# Altium footprint library Connector_PinHeader_1.27mm.PcbLib: 278 footprints (part 16 of 18)
Each footprint in its own frame and in the unit in brackets; x right, y up, seen from the top. Pads: shape width x height; smd on the part's side, far side on the other; paste and mask are expansions set on the pad; w line width, h text height; cw(c..) or ccw(c..) is an arc to the next point about the centre after c.
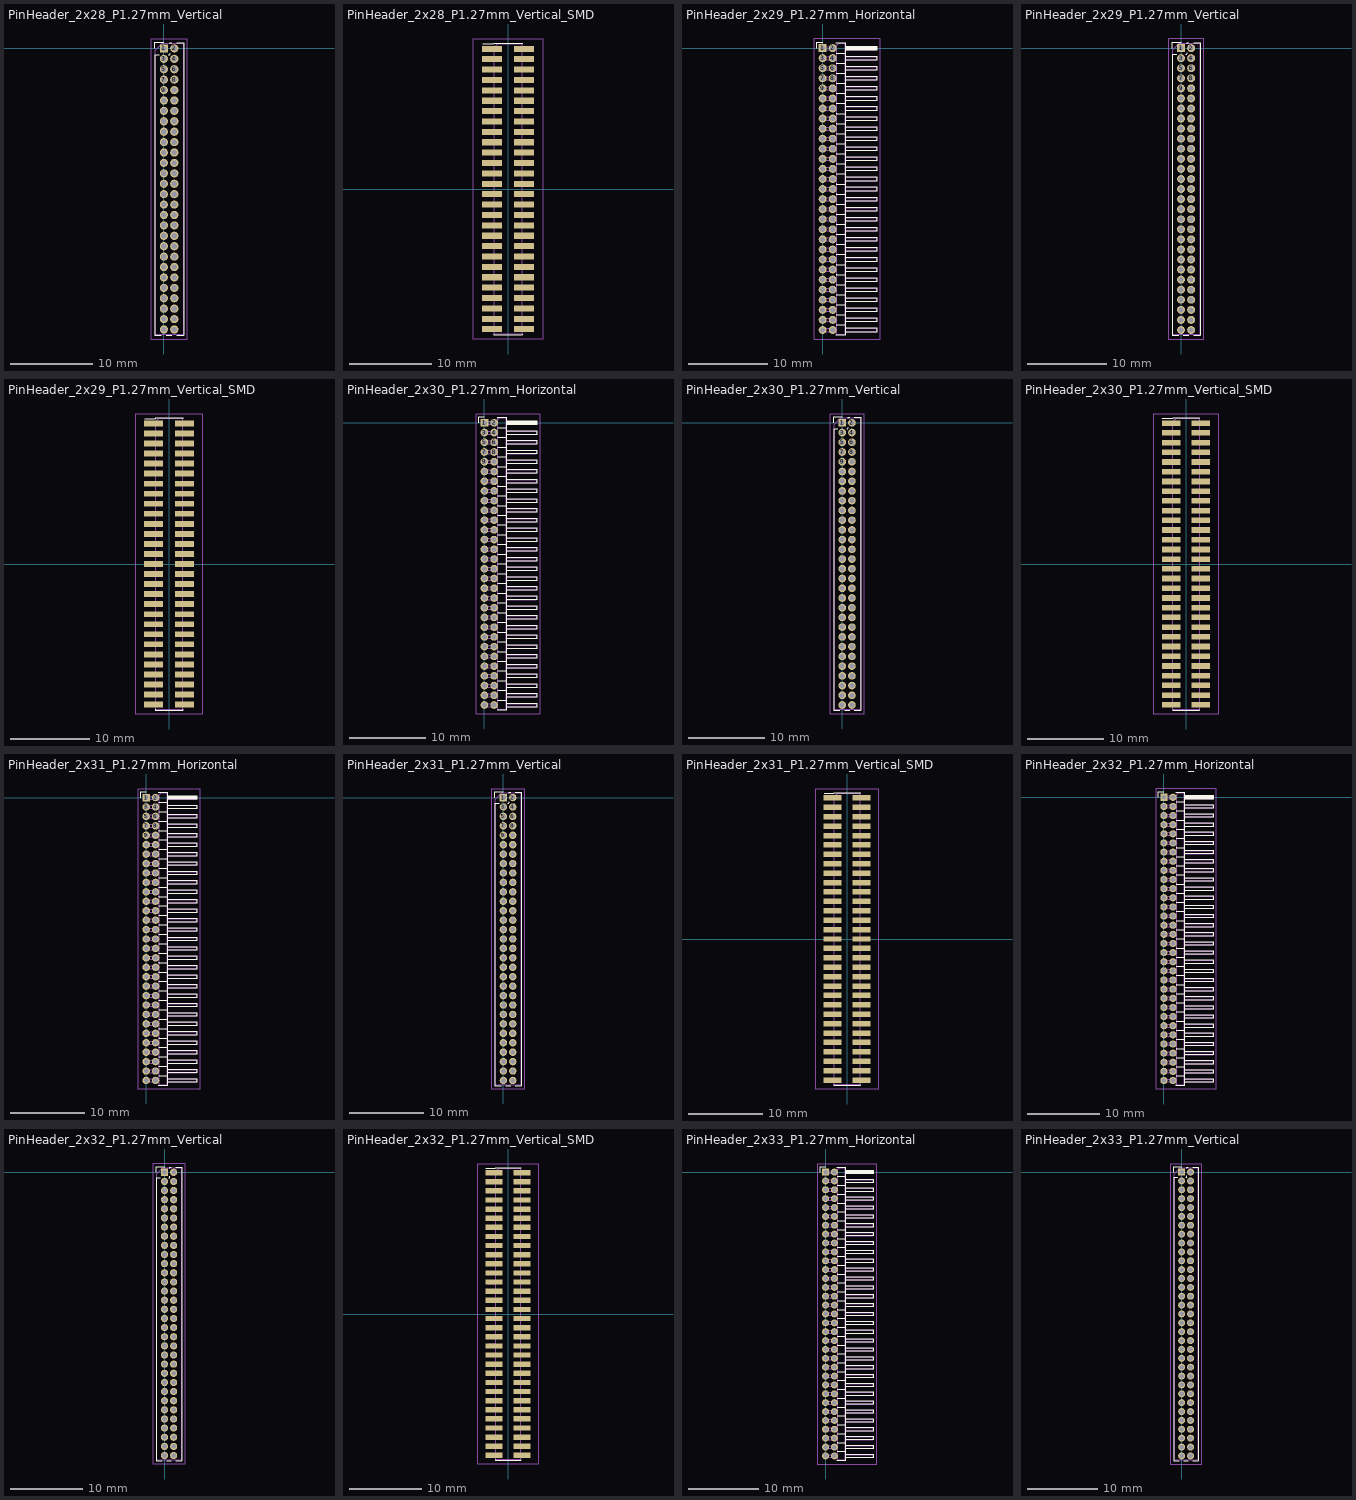
[diagram p15: the footprints below, top view; thin cyan lines are the x and y axes]

## PinHeader_2x28_P1.27mm_Vertical [mm]
pads (56):
  rect 1x1 hole 0.65: 1(0,0)
  rrect100% 1x1 hole 0.65: 2(1.27,0) 3(0,-1.27) 4(1.27,-1.27) 5(0,-2.54) 6(1.27,-2.54) 7(0,-3.81) 8(1.27,-3.81) 9(0,-5.08) 10(1.27,-5.08) 11(0,-6.35) 12(1.27,-6.35) 13(0,-7.62) 14(1.27,-7.62) 15(0,-8.89) 16(1.27,-8.89) 17(0,-10.16) 18(1.27,-10.16) 19(0,-11.43) 20(1.27,-11.43) 21(0,-12.7) 22(1.27,-12.7) 23(0,-13.97) 24(1.27,-13.97) 25(0,-15.24) 26(1.27,-15.24) 27(0,-16.51) 28(1.27,-16.51) 29(0,-17.78) 30(1.27,-17.78) 31(0,-19.05) 32(1.27,-19.05) 33(0,-20.32) 34(1.27,-20.32) 35(0,-21.59) 36(1.27,-21.59) 37(0,-22.86) 38(1.27,-22.86) 39(0,-24.13) 40(1.27,-24.13) 41(0,-25.4) 42(1.27,-25.4) 43(0,-26.67) 44(1.27,-26.67) 45(0,-27.94) 46(1.27,-27.94) 47(0,-29.21) 48(1.27,-29.21) 49(0,-30.48) 50(1.27,-30.48) 51(0,-31.75) 52(1.27,-31.75) 53(0,-33.02) 54(1.27,-33.02) 55(0,-34.29) 56(1.27,-34.29)
F.SilkS:
  lines w0.12: -1.13,0 -1.13,0.76 0,0.76 ; -0.563,-0.76 -1.13,-0.76 -1.13,-34.985 -0.308,-34.985 ; 0.308,-34.985 0.962,-34.985 ; 0.563,-0.76 0.707,-0.76 ; 0.76,-0.707 0.76,-0.563 ; 0.76,0.563 0.76,0.695 0.962,0.695 ; 1.578,-34.985 2.4,-34.985 2.4,0.695 1.578,0.695
F.CrtYd:
  lines w0.05: -1.6,-35.45 -1.6,1.15 2.85,1.15 2.85,-35.45 -1.6,-35.45
F.Fab:
  lines w0.1: -1.07,-34.925 2.34,-34.925 2.34,0.635 -0.218,0.635 -1.07,-0.218 -1.07,-34.925
  text "'.Designator'" at 1.475,-21.192 h1

## PinHeader_2x28_P1.27mm_Vertical_SMD [mm]
pads (56):
  rect 2.4x0.74 smd: 1(-1.95,17.145) 2(1.95,17.145) 3(-1.95,15.875) 4(1.95,15.875) 5(-1.95,14.605) 6(1.95,14.605) 7(-1.95,13.335) 8(1.95,13.335) 9(-1.95,12.065) 10(1.95,12.065) 11(-1.95,10.795) 12(1.95,10.795) 13(-1.95,9.525) 14(1.95,9.525) 15(-1.95,8.255) 16(1.95,8.255) 17(-1.95,6.985) 18(1.95,6.985) 19(-1.95,5.715) 20(1.95,5.715) 21(-1.95,4.445) 22(1.95,4.445) 23(-1.95,3.175) 24(1.95,3.175) 25(-1.95,1.905) 26(1.95,1.905) 27(-1.95,0.635) 28(1.95,0.635) 29(-1.95,-0.635) 30(1.95,-0.635) 31(-1.95,-1.905) 32(1.95,-1.905) 33(-1.95,-3.175) 34(1.95,-3.175) 35(-1.95,-4.445) 36(1.95,-4.445) 37(-1.95,-5.715) 38(1.95,-5.715) 39(-1.95,-6.985) 40(1.95,-6.985) 41(-1.95,-8.255) 42(1.95,-8.255) 43(-1.95,-9.525) 44(1.95,-9.525) 45(-1.95,-10.795) 46(1.95,-10.795) 47(-1.95,-12.065) 48(1.95,-12.065) 49(-1.95,-13.335) 50(1.95,-13.335) 51(-1.95,-14.605) 52(1.95,-14.605) 53(-1.95,-15.875) 54(1.95,-15.875) 55(-1.95,-17.145) 56(1.95,-17.145)
F.SilkS:
  lines w0.12: -3.09,17.775 -1.765,17.775 -1.765,17.84 1.765,17.84 1.765,17.775 ; -1.765,-17.775 -1.765,-17.84 1.765,-17.84 1.765,-17.775
F.CrtYd:
  lines w0.05: -4.3,-18.3 -4.3,18.3 4.3,18.3 4.3,-18.3 -4.3,-18.3
F.Fab:
  drawing of 173 lines, arcs and shapes, not listed
  text "'.Designator'" at 0.84,-4.047 h1

## PinHeader_2x29_P1.27mm_Horizontal [mm]
pads (58):
  rect 1x1 hole 0.65: 1(0,0)
  rrect100% 1x1 hole 0.65: 2(1.27,0) 3(0,-1.27) 4(1.27,-1.27) 5(0,-2.54) 6(1.27,-2.54) 7(0,-3.81) 8(1.27,-3.81) 9(0,-5.08) 10(1.27,-5.08) 11(0,-6.35) 12(1.27,-6.35) 13(0,-7.62) 14(1.27,-7.62) 15(0,-8.89) 16(1.27,-8.89) 17(0,-10.16) 18(1.27,-10.16) 19(0,-11.43) 20(1.27,-11.43) 21(0,-12.7) 22(1.27,-12.7) 23(0,-13.97) 24(1.27,-13.97) 25(0,-15.24) 26(1.27,-15.24) 27(0,-16.51) 28(1.27,-16.51) 29(0,-17.78) 30(1.27,-17.78) 31(0,-19.05) 32(1.27,-19.05) 33(0,-20.32) 34(1.27,-20.32) 35(0,-21.59) 36(1.27,-21.59) 37(0,-22.86) 38(1.27,-22.86) 39(0,-24.13) 40(1.27,-24.13) 41(0,-25.4) 42(1.27,-25.4) 43(0,-26.67) 44(1.27,-26.67) 45(0,-27.94) 46(1.27,-27.94) 47(0,-29.21) 48(1.27,-29.21) 49(0,-30.48) 50(1.27,-30.48) 51(0,-31.75) 52(1.27,-31.75) 53(0,-33.02) 54(1.27,-33.02) 55(0,-34.29) 56(1.27,-34.29) 57(0,-35.56) 58(1.27,-35.56)
F.SilkS:
  drawing of 154 lines, arcs and shapes, not listed
F.CrtYd:
  lines w0.05: -1.15,-36.7 -1.15,1.15 7.3,1.15 7.3,-36.7 -1.15,-36.7
F.Fab:
  drawing of 179 lines, arcs and shapes, not listed
  text "'.Designator'" at 2.774,-20.208 h0.6

## PinHeader_2x29_P1.27mm_Vertical [mm]
pads (58):
  rect 1x1 hole 0.65: 1(0,0)
  rrect100% 1x1 hole 0.65: 2(1.27,0) 3(0,-1.27) 4(1.27,-1.27) 5(0,-2.54) 6(1.27,-2.54) 7(0,-3.81) 8(1.27,-3.81) 9(0,-5.08) 10(1.27,-5.08) 11(0,-6.35) 12(1.27,-6.35) 13(0,-7.62) 14(1.27,-7.62) 15(0,-8.89) 16(1.27,-8.89) 17(0,-10.16) 18(1.27,-10.16) 19(0,-11.43) 20(1.27,-11.43) 21(0,-12.7) 22(1.27,-12.7) 23(0,-13.97) 24(1.27,-13.97) 25(0,-15.24) 26(1.27,-15.24) 27(0,-16.51) 28(1.27,-16.51) 29(0,-17.78) 30(1.27,-17.78) 31(0,-19.05) 32(1.27,-19.05) 33(0,-20.32) 34(1.27,-20.32) 35(0,-21.59) 36(1.27,-21.59) 37(0,-22.86) 38(1.27,-22.86) 39(0,-24.13) 40(1.27,-24.13) 41(0,-25.4) 42(1.27,-25.4) 43(0,-26.67) 44(1.27,-26.67) 45(0,-27.94) 46(1.27,-27.94) 47(0,-29.21) 48(1.27,-29.21) 49(0,-30.48) 50(1.27,-30.48) 51(0,-31.75) 52(1.27,-31.75) 53(0,-33.02) 54(1.27,-33.02) 55(0,-34.29) 56(1.27,-34.29) 57(0,-35.56) 58(1.27,-35.56)
F.SilkS:
  lines w0.12: -1.13,0 -1.13,0.76 0,0.76 ; -0.563,-0.76 -1.13,-0.76 -1.13,-36.255 -0.308,-36.255 ; 0.308,-36.255 0.962,-36.255 ; 0.563,-0.76 0.707,-0.76 ; 0.76,-0.707 0.76,-0.563 ; 0.76,0.563 0.76,0.695 0.962,0.695 ; 1.578,-36.255 2.4,-36.255 2.4,0.695 1.578,0.695
F.CrtYd:
  lines w0.05: -1.6,-36.7 2.85,-36.7 2.85,1.15 -1.6,1.15 -1.6,-36.7
F.Fab:
  lines w0.1: -1.07,-36.195 2.34,-36.195 2.34,0.635 -0.218,0.635 -1.07,-0.218 -1.07,-36.195
  text "'.Designator'" at 1.475,-21.827 h1

## PinHeader_2x29_P1.27mm_Vertical_SMD [mm]
pads (58):
  rect 2.4x0.74 smd: 1(-1.95,17.78) 2(1.95,17.78) 3(-1.95,16.51) 4(1.95,16.51) 5(-1.95,15.24) 6(1.95,15.24) 7(-1.95,13.97) 8(1.95,13.97) 9(-1.95,12.7) 10(1.95,12.7) 11(-1.95,11.43) 12(1.95,11.43) 13(-1.95,10.16) 14(1.95,10.16) 15(-1.95,8.89) 16(1.95,8.89) 17(-1.95,7.62) 18(1.95,7.62) 19(-1.95,6.35) 20(1.95,6.35) 21(-1.95,5.08) 22(1.95,5.08) 23(-1.95,3.81) 24(1.95,3.81) 25(-1.95,2.54) 26(1.95,2.54) 27(-1.95,1.27) 28(1.95,1.27) 29(-1.95,0) 30(1.95,0) 31(-1.95,-1.27) 32(1.95,-1.27) 33(-1.95,-2.54) 34(1.95,-2.54) 35(-1.95,-3.81) 36(1.95,-3.81) 37(-1.95,-5.08) 38(1.95,-5.08) 39(-1.95,-6.35) 40(1.95,-6.35) 41(-1.95,-7.62) 42(1.95,-7.62) 43(-1.95,-8.89) 44(1.95,-8.89) 45(-1.95,-10.16) 46(1.95,-10.16) 47(-1.95,-11.43) 48(1.95,-11.43) 49(-1.95,-12.7) 50(1.95,-12.7) 51(-1.95,-13.97) 52(1.95,-13.97) 53(-1.95,-15.24) 54(1.95,-15.24) 55(-1.95,-16.51) 56(1.95,-16.51) 57(-1.95,-17.78) 58(1.95,-17.78)
F.SilkS:
  lines w0.12: -3.09,18.41 -1.765,18.41 -1.765,18.475 1.765,18.475 1.765,18.41 ; -1.765,-18.41 -1.765,-18.475 1.765,-18.475 1.765,-18.41
F.CrtYd:
  lines w0.05: -4.3,-18.95 -4.3,18.95 4.3,18.95 4.3,-18.95 -4.3,-18.95
F.Fab:
  drawing of 179 lines, arcs and shapes, not listed
  text "'.Designator'" at 0.84,-4.047 h1

## PinHeader_2x30_P1.27mm_Horizontal [mm]
pads (60):
  rect 1x1 hole 0.65: 1(0,0)
  rrect100% 1x1 hole 0.65: 2(1.27,0) 3(0,-1.27) 4(1.27,-1.27) 5(0,-2.54) 6(1.27,-2.54) 7(0,-3.81) 8(1.27,-3.81) 9(0,-5.08) 10(1.27,-5.08) 11(0,-6.35) 12(1.27,-6.35) 13(0,-7.62) 14(1.27,-7.62) 15(0,-8.89) 16(1.27,-8.89) 17(0,-10.16) 18(1.27,-10.16) 19(0,-11.43) 20(1.27,-11.43) 21(0,-12.7) 22(1.27,-12.7) 23(0,-13.97) 24(1.27,-13.97) 25(0,-15.24) 26(1.27,-15.24) 27(0,-16.51) 28(1.27,-16.51) 29(0,-17.78) 30(1.27,-17.78) 31(0,-19.05) 32(1.27,-19.05) 33(0,-20.32) 34(1.27,-20.32) 35(0,-21.59) 36(1.27,-21.59) 37(0,-22.86) 38(1.27,-22.86) 39(0,-24.13) 40(1.27,-24.13) 41(0,-25.4) 42(1.27,-25.4) 43(0,-26.67) 44(1.27,-26.67) 45(0,-27.94) 46(1.27,-27.94) 47(0,-29.21) 48(1.27,-29.21) 49(0,-30.48) 50(1.27,-30.48) 51(0,-31.75) 52(1.27,-31.75) 53(0,-33.02) 54(1.27,-33.02) 55(0,-34.29) 56(1.27,-34.29) 57(0,-35.56) 58(1.27,-35.56) 59(0,-36.83) 60(1.27,-36.83)
F.SilkS:
  drawing of 159 lines, arcs and shapes, not listed
F.CrtYd:
  lines w0.05: -1.15,-38 7.3,-38 7.3,1.15 -1.15,1.15 -1.15,-38
F.Fab:
  drawing of 185 lines, arcs and shapes, not listed
  text "'.Designator'" at 2.774,-20.843 h0.6

## PinHeader_2x30_P1.27mm_Vertical [mm]
pads (60):
  rect 1x1 hole 0.65: 1(0,0)
  rrect100% 1x1 hole 0.65: 2(1.27,0) 3(0,-1.27) 4(1.27,-1.27) 5(0,-2.54) 6(1.27,-2.54) 7(0,-3.81) 8(1.27,-3.81) 9(0,-5.08) 10(1.27,-5.08) 11(0,-6.35) 12(1.27,-6.35) 13(0,-7.62) 14(1.27,-7.62) 15(0,-8.89) 16(1.27,-8.89) 17(0,-10.16) 18(1.27,-10.16) 19(0,-11.43) 20(1.27,-11.43) 21(0,-12.7) 22(1.27,-12.7) 23(0,-13.97) 24(1.27,-13.97) 25(0,-15.24) 26(1.27,-15.24) 27(0,-16.51) 28(1.27,-16.51) 29(0,-17.78) 30(1.27,-17.78) 31(0,-19.05) 32(1.27,-19.05) 33(0,-20.32) 34(1.27,-20.32) 35(0,-21.59) 36(1.27,-21.59) 37(0,-22.86) 38(1.27,-22.86) 39(0,-24.13) 40(1.27,-24.13) 41(0,-25.4) 42(1.27,-25.4) 43(0,-26.67) 44(1.27,-26.67) 45(0,-27.94) 46(1.27,-27.94) 47(0,-29.21) 48(1.27,-29.21) 49(0,-30.48) 50(1.27,-30.48) 51(0,-31.75) 52(1.27,-31.75) 53(0,-33.02) 54(1.27,-33.02) 55(0,-34.29) 56(1.27,-34.29) 57(0,-35.56) 58(1.27,-35.56) 59(0,-36.83) 60(1.27,-36.83)
F.SilkS:
  lines w0.12: -1.13,0 -1.13,0.76 0,0.76 ; -0.563,-0.76 -1.13,-0.76 -1.13,-37.525 -0.308,-37.525 ; 0.308,-37.525 0.962,-37.525 ; 0.563,-0.76 0.707,-0.76 ; 0.76,-0.707 0.76,-0.563 ; 0.76,0.563 0.76,0.695 0.962,0.695 ; 1.578,-37.525 2.4,-37.525 2.4,0.695 1.578,0.695
F.CrtYd:
  lines w0.05: -1.6,-38 -1.6,1.15 2.85,1.15 2.85,-38 -1.6,-38
F.Fab:
  lines w0.1: -1.07,-37.465 2.34,-37.465 2.34,0.635 -0.218,0.635 -1.07,-0.218 -1.07,-37.465
  text "'.Designator'" at 1.475,-22.462 h1

## PinHeader_2x30_P1.27mm_Vertical_SMD [mm]
pads (60):
  rect 2.4x0.74 smd: 1(-1.95,18.415) 2(1.95,18.415) 3(-1.95,17.145) 4(1.95,17.145) 5(-1.95,15.875) 6(1.95,15.875) 7(-1.95,14.605) 8(1.95,14.605) 9(-1.95,13.335) 10(1.95,13.335) 11(-1.95,12.065) 12(1.95,12.065) 13(-1.95,10.795) 14(1.95,10.795) 15(-1.95,9.525) 16(1.95,9.525) 17(-1.95,8.255) 18(1.95,8.255) 19(-1.95,6.985) 20(1.95,6.985) 21(-1.95,5.715) 22(1.95,5.715) 23(-1.95,4.445) 24(1.95,4.445) 25(-1.95,3.175) 26(1.95,3.175) 27(-1.95,1.905) 28(1.95,1.905) 29(-1.95,0.635) 30(1.95,0.635) 31(-1.95,-0.635) 32(1.95,-0.635) 33(-1.95,-1.905) 34(1.95,-1.905) 35(-1.95,-3.175) 36(1.95,-3.175) 37(-1.95,-4.445) 38(1.95,-4.445) 39(-1.95,-5.715) 40(1.95,-5.715) 41(-1.95,-6.985) 42(1.95,-6.985) 43(-1.95,-8.255) 44(1.95,-8.255) 45(-1.95,-9.525) 46(1.95,-9.525) 47(-1.95,-10.795) 48(1.95,-10.795) 49(-1.95,-12.065) 50(1.95,-12.065) 51(-1.95,-13.335) 52(1.95,-13.335) 53(-1.95,-14.605) 54(1.95,-14.605) 55(-1.95,-15.875) 56(1.95,-15.875) 57(-1.95,-17.145) 58(1.95,-17.145) 59(-1.95,-18.415) 60(1.95,-18.415)
F.SilkS:
  lines w0.12: -3.09,19.045 -1.765,19.045 -1.765,19.11 1.765,19.11 1.765,19.045 ; -1.765,-19.045 -1.765,-19.11 1.765,-19.11 1.765,-19.045
F.CrtYd:
  lines w0.05: -4.3,-19.55 4.3,-19.55 4.3,19.55 -4.3,19.55 -4.3,-19.55
F.Fab:
  drawing of 185 lines, arcs and shapes, not listed
  text "'.Designator'" at 0.84,-4.047 h1

## PinHeader_2x31_P1.27mm_Horizontal [mm]
pads (62):
  rect 1x1 hole 0.65: 1(0,0)
  rrect100% 1x1 hole 0.65: 2(1.27,0) 3(0,-1.27) 4(1.27,-1.27) 5(0,-2.54) 6(1.27,-2.54) 7(0,-3.81) 8(1.27,-3.81) 9(0,-5.08) 10(1.27,-5.08) 11(0,-6.35) 12(1.27,-6.35) 13(0,-7.62) 14(1.27,-7.62) 15(0,-8.89) 16(1.27,-8.89) 17(0,-10.16) 18(1.27,-10.16) 19(0,-11.43) 20(1.27,-11.43) 21(0,-12.7) 22(1.27,-12.7) 23(0,-13.97) 24(1.27,-13.97) 25(0,-15.24) 26(1.27,-15.24) 27(0,-16.51) 28(1.27,-16.51) 29(0,-17.78) 30(1.27,-17.78) 31(0,-19.05) 32(1.27,-19.05) 33(0,-20.32) 34(1.27,-20.32) 35(0,-21.59) 36(1.27,-21.59) 37(0,-22.86) 38(1.27,-22.86) 39(0,-24.13) 40(1.27,-24.13) 41(0,-25.4) 42(1.27,-25.4) 43(0,-26.67) 44(1.27,-26.67) 45(0,-27.94) 46(1.27,-27.94) 47(0,-29.21) 48(1.27,-29.21) 49(0,-30.48) 50(1.27,-30.48) 51(0,-31.75) 52(1.27,-31.75) 53(0,-33.02) 54(1.27,-33.02) 55(0,-34.29) 56(1.27,-34.29) 57(0,-35.56) 58(1.27,-35.56) 59(0,-36.83) 60(1.27,-36.83) 61(0,-38.1) 62(1.27,-38.1)
F.SilkS:
  drawing of 164 lines, arcs and shapes, not listed
F.CrtYd:
  lines w0.05: -1.15,-39.25 7.3,-39.25 7.3,1.15 -1.15,1.15 -1.15,-39.25
F.Fab:
  drawing of 191 lines, arcs and shapes, not listed
  text "'.Designator'" at 2.774,-21.478 h0.6

## PinHeader_2x31_P1.27mm_Vertical [mm]
pads (62):
  rect 1x1 hole 0.65: 1(0,0)
  rrect100% 1x1 hole 0.65: 2(1.27,0) 3(0,-1.27) 4(1.27,-1.27) 5(0,-2.54) 6(1.27,-2.54) 7(0,-3.81) 8(1.27,-3.81) 9(0,-5.08) 10(1.27,-5.08) 11(0,-6.35) 12(1.27,-6.35) 13(0,-7.62) 14(1.27,-7.62) 15(0,-8.89) 16(1.27,-8.89) 17(0,-10.16) 18(1.27,-10.16) 19(0,-11.43) 20(1.27,-11.43) 21(0,-12.7) 22(1.27,-12.7) 23(0,-13.97) 24(1.27,-13.97) 25(0,-15.24) 26(1.27,-15.24) 27(0,-16.51) 28(1.27,-16.51) 29(0,-17.78) 30(1.27,-17.78) 31(0,-19.05) 32(1.27,-19.05) 33(0,-20.32) 34(1.27,-20.32) 35(0,-21.59) 36(1.27,-21.59) 37(0,-22.86) 38(1.27,-22.86) 39(0,-24.13) 40(1.27,-24.13) 41(0,-25.4) 42(1.27,-25.4) 43(0,-26.67) 44(1.27,-26.67) 45(0,-27.94) 46(1.27,-27.94) 47(0,-29.21) 48(1.27,-29.21) 49(0,-30.48) 50(1.27,-30.48) 51(0,-31.75) 52(1.27,-31.75) 53(0,-33.02) 54(1.27,-33.02) 55(0,-34.29) 56(1.27,-34.29) 57(0,-35.56) 58(1.27,-35.56) 59(0,-36.83) 60(1.27,-36.83) 61(0,-38.1) 62(1.27,-38.1)
F.SilkS:
  lines w0.12: -1.13,0 -1.13,0.76 0,0.76 ; -0.563,-0.76 -1.13,-0.76 -1.13,-38.795 -0.308,-38.795 ; 0.308,-38.795 0.962,-38.795 ; 0.563,-0.76 0.707,-0.76 ; 0.76,-0.707 0.76,-0.563 ; 0.76,0.563 0.76,0.695 0.962,0.695 ; 1.578,-38.795 2.4,-38.795 2.4,0.695 1.578,0.695
F.CrtYd:
  lines w0.05: -1.6,-39.25 2.85,-39.25 2.85,1.15 -1.6,1.15 -1.6,-39.25
F.Fab:
  lines w0.1: -1.07,-38.735 2.34,-38.735 2.34,0.635 -0.218,0.635 -1.07,-0.218 -1.07,-38.735
  text "'.Designator'" at 1.475,-23.097 h1

## PinHeader_2x31_P1.27mm_Vertical_SMD [mm]
pads (62):
  rect 2.4x0.74 smd: 1(-1.95,19.05) 2(1.95,19.05) 3(-1.95,17.78) 4(1.95,17.78) 5(-1.95,16.51) 6(1.95,16.51) 7(-1.95,15.24) 8(1.95,15.24) 9(-1.95,13.97) 10(1.95,13.97) 11(-1.95,12.7) 12(1.95,12.7) 13(-1.95,11.43) 14(1.95,11.43) 15(-1.95,10.16) 16(1.95,10.16) 17(-1.95,8.89) 18(1.95,8.89) 19(-1.95,7.62) 20(1.95,7.62) 21(-1.95,6.35) 22(1.95,6.35) 23(-1.95,5.08) 24(1.95,5.08) 25(-1.95,3.81) 26(1.95,3.81) 27(-1.95,2.54) 28(1.95,2.54) 29(-1.95,1.27) 30(1.95,1.27) 31(-1.95,0) 32(1.95,0) 33(-1.95,-1.27) 34(1.95,-1.27) 35(-1.95,-2.54) 36(1.95,-2.54) 37(-1.95,-3.81) 38(1.95,-3.81) 39(-1.95,-5.08) 40(1.95,-5.08) 41(-1.95,-6.35) 42(1.95,-6.35) 43(-1.95,-7.62) 44(1.95,-7.62) 45(-1.95,-8.89) 46(1.95,-8.89) 47(-1.95,-10.16) 48(1.95,-10.16) 49(-1.95,-11.43) 50(1.95,-11.43) 51(-1.95,-12.7) 52(1.95,-12.7) 53(-1.95,-13.97) 54(1.95,-13.97) 55(-1.95,-15.24) 56(1.95,-15.24) 57(-1.95,-16.51) 58(1.95,-16.51) 59(-1.95,-17.78) 60(1.95,-17.78) 61(-1.95,-19.05) 62(1.95,-19.05)
F.SilkS:
  lines w0.12: -3.09,19.68 -1.765,19.68 -1.765,19.745 1.765,19.745 1.765,19.68 ; -1.765,-19.68 -1.765,-19.745 1.765,-19.745 1.765,-19.68
F.CrtYd:
  lines w0.05: -4.3,-20.2 4.3,-20.2 4.3,20.2 -4.3,20.2 -4.3,-20.2
F.Fab:
  drawing of 191 lines, arcs and shapes, not listed
  text "'.Designator'" at 0.84,-4.047 h1

## PinHeader_2x32_P1.27mm_Horizontal [mm]
pads (64):
  rect 1x1 hole 0.65: 1(0,0)
  rrect100% 1x1 hole 0.65: 2(1.27,0) 3(0,-1.27) 4(1.27,-1.27) 5(0,-2.54) 6(1.27,-2.54) 7(0,-3.81) 8(1.27,-3.81) 9(0,-5.08) 10(1.27,-5.08) 11(0,-6.35) 12(1.27,-6.35) 13(0,-7.62) 14(1.27,-7.62) 15(0,-8.89) 16(1.27,-8.89) 17(0,-10.16) 18(1.27,-10.16) 19(0,-11.43) 20(1.27,-11.43) 21(0,-12.7) 22(1.27,-12.7) 23(0,-13.97) 24(1.27,-13.97) 25(0,-15.24) 26(1.27,-15.24) 27(0,-16.51) 28(1.27,-16.51) 29(0,-17.78) 30(1.27,-17.78) 31(0,-19.05) 32(1.27,-19.05) 33(0,-20.32) 34(1.27,-20.32) 35(0,-21.59) 36(1.27,-21.59) 37(0,-22.86) 38(1.27,-22.86) 39(0,-24.13) 40(1.27,-24.13) 41(0,-25.4) 42(1.27,-25.4) 43(0,-26.67) 44(1.27,-26.67) 45(0,-27.94) 46(1.27,-27.94) 47(0,-29.21) 48(1.27,-29.21) 49(0,-30.48) 50(1.27,-30.48) 51(0,-31.75) 52(1.27,-31.75) 53(0,-33.02) 54(1.27,-33.02) 55(0,-34.29) 56(1.27,-34.29) 57(0,-35.56) 58(1.27,-35.56) 59(0,-36.83) 60(1.27,-36.83) 61(0,-38.1) 62(1.27,-38.1) 63(0,-39.37) 64(1.27,-39.37)
F.SilkS:
  drawing of 169 lines, arcs and shapes, not listed
F.CrtYd:
  lines w0.05: -1.15,-40.55 7.3,-40.55 7.3,1.15 -1.15,1.15 -1.15,-40.55
F.Fab:
  drawing of 197 lines, arcs and shapes, not listed
  text "'.Designator'" at 2.774,-22.113 h0.6

## PinHeader_2x32_P1.27mm_Vertical [mm]
pads (64):
  rect 1x1 hole 0.65: 1(0,0)
  rrect100% 1x1 hole 0.65: 2(1.27,0) 3(0,-1.27) 4(1.27,-1.27) 5(0,-2.54) 6(1.27,-2.54) 7(0,-3.81) 8(1.27,-3.81) 9(0,-5.08) 10(1.27,-5.08) 11(0,-6.35) 12(1.27,-6.35) 13(0,-7.62) 14(1.27,-7.62) 15(0,-8.89) 16(1.27,-8.89) 17(0,-10.16) 18(1.27,-10.16) 19(0,-11.43) 20(1.27,-11.43) 21(0,-12.7) 22(1.27,-12.7) 23(0,-13.97) 24(1.27,-13.97) 25(0,-15.24) 26(1.27,-15.24) 27(0,-16.51) 28(1.27,-16.51) 29(0,-17.78) 30(1.27,-17.78) 31(0,-19.05) 32(1.27,-19.05) 33(0,-20.32) 34(1.27,-20.32) 35(0,-21.59) 36(1.27,-21.59) 37(0,-22.86) 38(1.27,-22.86) 39(0,-24.13) 40(1.27,-24.13) 41(0,-25.4) 42(1.27,-25.4) 43(0,-26.67) 44(1.27,-26.67) 45(0,-27.94) 46(1.27,-27.94) 47(0,-29.21) 48(1.27,-29.21) 49(0,-30.48) 50(1.27,-30.48) 51(0,-31.75) 52(1.27,-31.75) 53(0,-33.02) 54(1.27,-33.02) 55(0,-34.29) 56(1.27,-34.29) 57(0,-35.56) 58(1.27,-35.56) 59(0,-36.83) 60(1.27,-36.83) 61(0,-38.1) 62(1.27,-38.1) 63(0,-39.37) 64(1.27,-39.37)
F.SilkS:
  lines w0.12: -1.13,0 -1.13,0.76 0,0.76 ; -0.563,-0.76 -1.13,-0.76 -1.13,-40.065 -0.308,-40.065 ; 0.308,-40.065 0.962,-40.065 ; 0.563,-0.76 0.707,-0.76 ; 0.76,-0.707 0.76,-0.563 ; 0.76,0.563 0.76,0.695 0.962,0.695 ; 1.578,-40.065 2.4,-40.065 2.4,0.695 1.578,0.695
F.CrtYd:
  lines w0.05: -1.6,-40.55 -1.6,1.15 2.85,1.15 2.85,-40.55 -1.6,-40.55
F.Fab:
  lines w0.1: -1.07,-40.005 -1.07,-0.218 -0.218,0.635 2.34,0.635 2.34,-40.005 -1.07,-40.005
  text "'.Designator'" at 1.475,-23.732 h1

## PinHeader_2x32_P1.27mm_Vertical_SMD [mm]
pads (64):
  rect 2.4x0.74 smd: 1(-1.95,19.685) 2(1.95,19.685) 3(-1.95,18.415) 4(1.95,18.415) 5(-1.95,17.145) 6(1.95,17.145) 7(-1.95,15.875) 8(1.95,15.875) 9(-1.95,14.605) 10(1.95,14.605) 11(-1.95,13.335) 12(1.95,13.335) 13(-1.95,12.065) 14(1.95,12.065) 15(-1.95,10.795) 16(1.95,10.795) 17(-1.95,9.525) 18(1.95,9.525) 19(-1.95,8.255) 20(1.95,8.255) 21(-1.95,6.985) 22(1.95,6.985) 23(-1.95,5.715) 24(1.95,5.715) 25(-1.95,4.445) 26(1.95,4.445) 27(-1.95,3.175) 28(1.95,3.175) 29(-1.95,1.905) 30(1.95,1.905) 31(-1.95,0.635) 32(1.95,0.635) 33(-1.95,-0.635) 34(1.95,-0.635) 35(-1.95,-1.905) 36(1.95,-1.905) 37(-1.95,-3.175) 38(1.95,-3.175) 39(-1.95,-4.445) 40(1.95,-4.445) 41(-1.95,-5.715) 42(1.95,-5.715) 43(-1.95,-6.985) 44(1.95,-6.985) 45(-1.95,-8.255) 46(1.95,-8.255) 47(-1.95,-9.525) 48(1.95,-9.525) 49(-1.95,-10.795) 50(1.95,-10.795) 51(-1.95,-12.065) 52(1.95,-12.065) 53(-1.95,-13.335) 54(1.95,-13.335) 55(-1.95,-14.605) 56(1.95,-14.605) 57(-1.95,-15.875) 58(1.95,-15.875) 59(-1.95,-17.145) 60(1.95,-17.145) 61(-1.95,-18.415) 62(1.95,-18.415) 63(-1.95,-19.685) 64(1.95,-19.685)
F.SilkS:
  lines w0.12: -3.09,20.315 -1.765,20.315 -1.765,20.38 1.765,20.38 1.765,20.315 ; -1.765,-20.315 -1.765,-20.38 1.765,-20.38 1.765,-20.315
F.CrtYd:
  lines w0.05: -4.3,-20.85 4.3,-20.85 4.3,20.85 -4.3,20.85 -4.3,-20.85
F.Fab:
  drawing of 197 lines, arcs and shapes, not listed
  text "'.Designator'" at 0.84,-4.047 h1

## PinHeader_2x33_P1.27mm_Horizontal [mm]
pads (66):
  rect 1x1 hole 0.65: 1(0,0)
  rrect100% 1x1 hole 0.65: 2(1.27,0) 3(0,-1.27) 4(1.27,-1.27) 5(0,-2.54) 6(1.27,-2.54) 7(0,-3.81) 8(1.27,-3.81) 9(0,-5.08) 10(1.27,-5.08) 11(0,-6.35) 12(1.27,-6.35) 13(0,-7.62) 14(1.27,-7.62) 15(0,-8.89) 16(1.27,-8.89) 17(0,-10.16) 18(1.27,-10.16) 19(0,-11.43) 20(1.27,-11.43) 21(0,-12.7) 22(1.27,-12.7) 23(0,-13.97) 24(1.27,-13.97) 25(0,-15.24) 26(1.27,-15.24) 27(0,-16.51) 28(1.27,-16.51) 29(0,-17.78) 30(1.27,-17.78) 31(0,-19.05) 32(1.27,-19.05) 33(0,-20.32) 34(1.27,-20.32) 35(0,-21.59) 36(1.27,-21.59) 37(0,-22.86) 38(1.27,-22.86) 39(0,-24.13) 40(1.27,-24.13) 41(0,-25.4) 42(1.27,-25.4) 43(0,-26.67) 44(1.27,-26.67) 45(0,-27.94) 46(1.27,-27.94) 47(0,-29.21) 48(1.27,-29.21) 49(0,-30.48) 50(1.27,-30.48) 51(0,-31.75) 52(1.27,-31.75) 53(0,-33.02) 54(1.27,-33.02) 55(0,-34.29) 56(1.27,-34.29) 57(0,-35.56) 58(1.27,-35.56) 59(0,-36.83) 60(1.27,-36.83) 61(0,-38.1) 62(1.27,-38.1) 63(0,-39.37) 64(1.27,-39.37) 65(0,-40.64) 66(1.27,-40.64)
F.SilkS:
  drawing of 174 lines, arcs and shapes, not listed
F.CrtYd:
  lines w0.05: -1.15,-41.8 7.3,-41.8 7.3,1.15 -1.15,1.15 -1.15,-41.8
F.Fab:
  drawing of 203 lines, arcs and shapes, not listed
  text "'.Designator'" at 2.774,-22.748 h0.6

## PinHeader_2x33_P1.27mm_Vertical [mm]
pads (66):
  rect 1x1 hole 0.65: 1(0,0)
  rrect100% 1x1 hole 0.65: 2(1.27,0) 3(0,-1.27) 4(1.27,-1.27) 5(0,-2.54) 6(1.27,-2.54) 7(0,-3.81) 8(1.27,-3.81) 9(0,-5.08) 10(1.27,-5.08) 11(0,-6.35) 12(1.27,-6.35) 13(0,-7.62) 14(1.27,-7.62) 15(0,-8.89) 16(1.27,-8.89) 17(0,-10.16) 18(1.27,-10.16) 19(0,-11.43) 20(1.27,-11.43) 21(0,-12.7) 22(1.27,-12.7) 23(0,-13.97) 24(1.27,-13.97) 25(0,-15.24) 26(1.27,-15.24) 27(0,-16.51) 28(1.27,-16.51) 29(0,-17.78) 30(1.27,-17.78) 31(0,-19.05) 32(1.27,-19.05) 33(0,-20.32) 34(1.27,-20.32) 35(0,-21.59) 36(1.27,-21.59) 37(0,-22.86) 38(1.27,-22.86) 39(0,-24.13) 40(1.27,-24.13) 41(0,-25.4) 42(1.27,-25.4) 43(0,-26.67) 44(1.27,-26.67) 45(0,-27.94) 46(1.27,-27.94) 47(0,-29.21) 48(1.27,-29.21) 49(0,-30.48) 50(1.27,-30.48) 51(0,-31.75) 52(1.27,-31.75) 53(0,-33.02) 54(1.27,-33.02) 55(0,-34.29) 56(1.27,-34.29) 57(0,-35.56) 58(1.27,-35.56) 59(0,-36.83) 60(1.27,-36.83) 61(0,-38.1) 62(1.27,-38.1) 63(0,-39.37) 64(1.27,-39.37) 65(0,-40.64) 66(1.27,-40.64)
F.SilkS:
  lines w0.12: -1.13,0 -1.13,0.76 0,0.76 ; -0.563,-0.76 -1.13,-0.76 -1.13,-41.335 -0.308,-41.335 ; 0.308,-41.335 0.962,-41.335 ; 0.563,-0.76 0.707,-0.76 ; 0.76,-0.707 0.76,-0.563 ; 0.76,0.563 0.76,0.695 0.962,0.695 ; 1.578,-41.335 2.4,-41.335 2.4,0.695 1.578,0.695
F.CrtYd:
  lines w0.05: -1.6,-41.8 -1.6,1.15 2.85,1.15 2.85,-41.8 -1.6,-41.8
F.Fab:
  lines w0.1: -1.07,-41.275 -1.07,-0.218 -0.218,0.635 2.34,0.635 2.34,-41.275 -1.07,-41.275
  text "'.Designator'" at 1.475,-24.367 h1